# Altium footprint library Connector_Samtec_HLE_SMD.PcbLib: 290 footprints (part 7 of 24)
Each footprint in its own frame and in the unit in brackets; x right, y up, seen from the top. Pads: shape width x height; smd on the part's side, far side on the other; paste and mask are expansions set on the pad; w line width, h text height; cw(c..) or ccw(c..) is an arc to the next point about the centre after c.
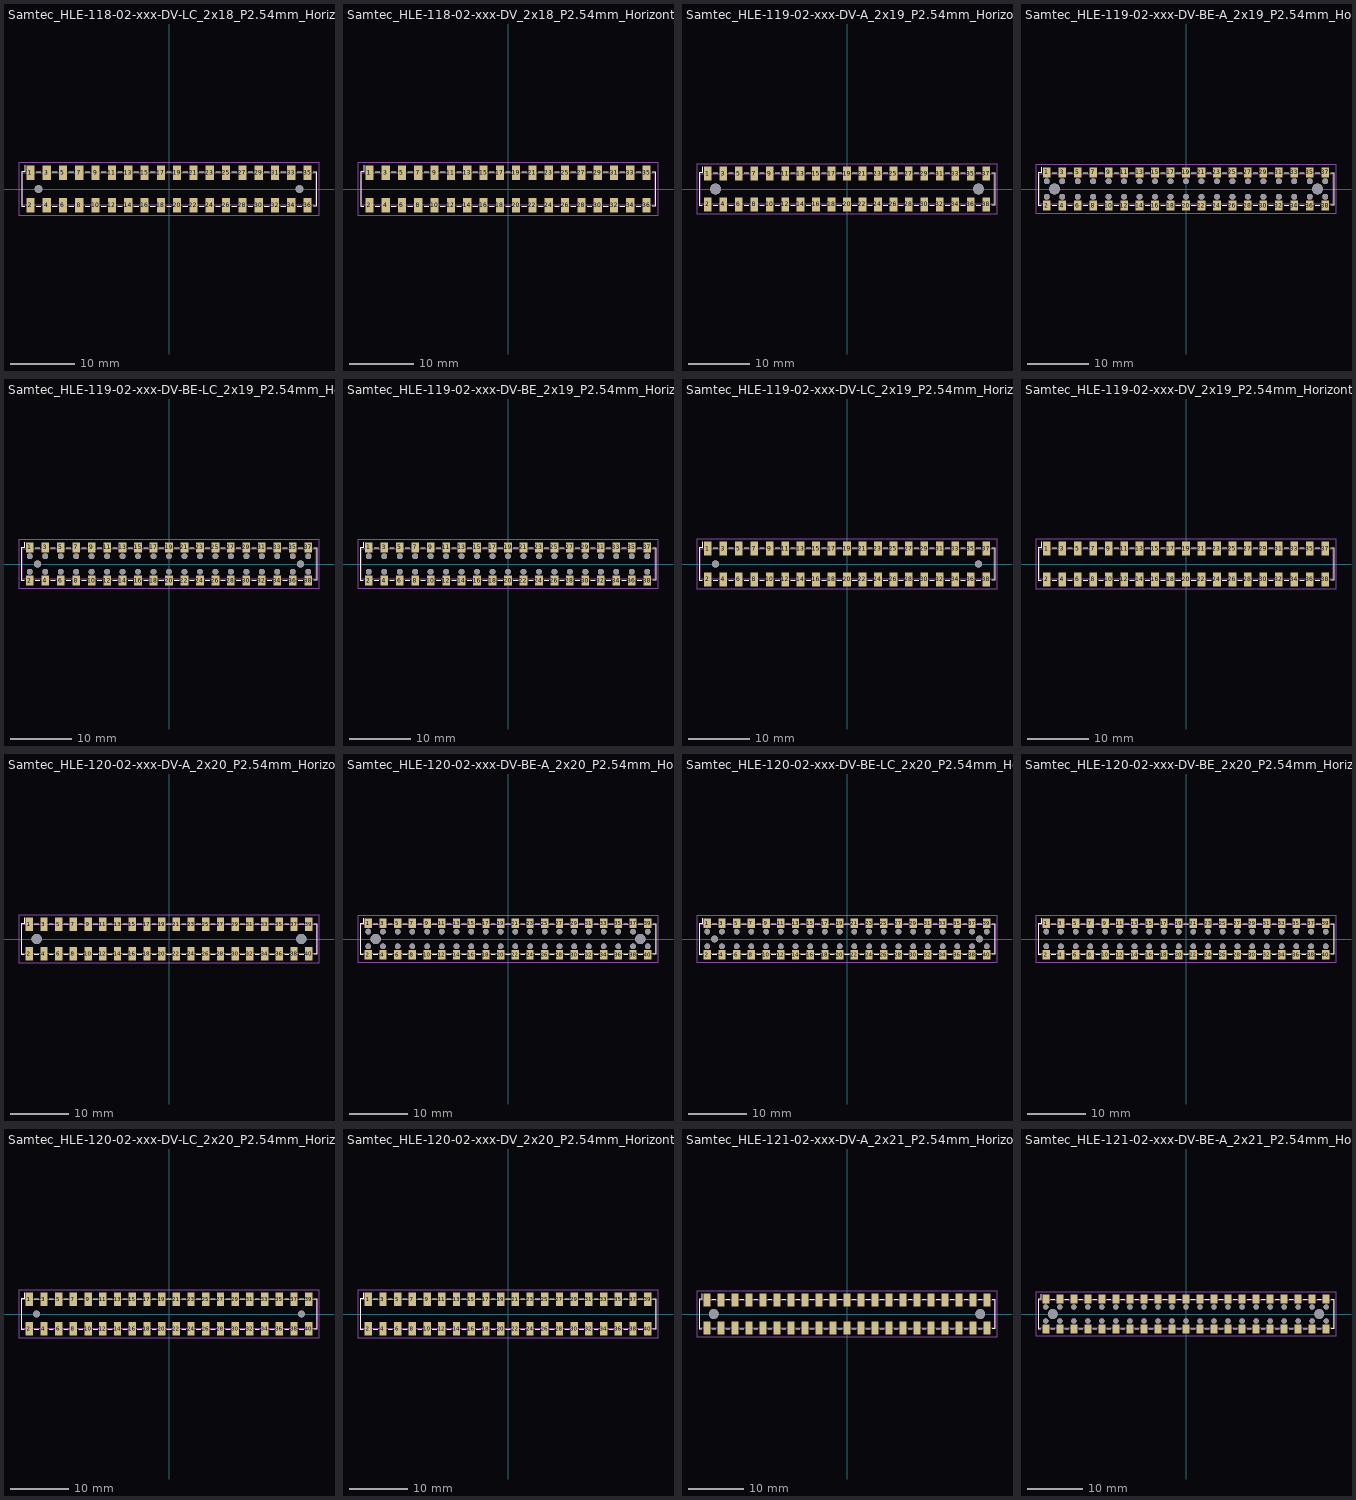
[diagram p6: the footprints below, top view; thin cyan lines are the x and y axes]

## Samtec_HLE-118-02-xxx-DV-LC_2x18_P2.54mm_Horizontal [mm]
pads (38):
  rect 1.27x2.29 smd: 1(-21.59,2.525) 2(-21.59,-2.525) 3(-19.05,2.525) 4(-19.05,-2.525) 5(-16.51,2.525) 6(-16.51,-2.525) 7(-13.97,2.525) 8(-13.97,-2.525) 9(-11.43,2.525) 10(-11.43,-2.525) 11(-8.89,2.525) 12(-8.89,-2.525) 13(-6.35,2.525) 14(-6.35,-2.525) 15(-3.81,2.525) 16(-3.81,-2.525) 17(-1.27,2.525) 18(-1.27,-2.525) 19(1.27,2.525) 20(1.27,-2.525) 21(3.81,2.525) 22(3.81,-2.525) 23(6.35,2.525) 24(6.35,-2.525) 25(8.89,2.525) 26(8.89,-2.525) 27(11.43,2.525) 28(11.43,-2.525) 29(13.97,2.525) 30(13.97,-2.525) 31(16.51,2.525) 32(16.51,-2.525) 33(19.05,2.525) 34(19.05,-2.525) 35(21.59,2.525) 36(21.59,-2.525)
  round 1.19 hole 1.19: Un1(20.32,0) Un2(-20.32,0)
F.SilkS:
  lines w0.12: -22.485,-2.65 -22.97,-2.65 -22.97,2.65 -22.485,2.65 -22.485,3.67 ; -20.695,-2.65 -19.945,-2.65 ; -20.695,2.65 -19.945,2.65 ; -18.155,-2.65 -17.405,-2.65 ; -18.155,2.65 -17.405,2.65 ; -15.615,-2.65 -14.865,-2.65 ; -15.615,2.65 -14.865,2.65 ; -13.075,-2.65 -12.325,-2.65 ; -13.075,2.65 -12.325,2.65 ; -10.535,-2.65 -9.785,-2.65 ; -10.535,2.65 -9.785,2.65 ; -7.995,-2.65 -7.245,-2.65 ; -7.995,2.65 -7.245,2.65 ; -5.455,-2.65 -4.705,-2.65 ; -5.455,2.65 -4.705,2.65 ; -2.915,-2.65 -2.165,-2.65 ; -2.915,2.65 -2.165,2.65 ; -0.375,-2.65 0.375,-2.65 ; -0.375,2.65 0.375,2.65 ; 2.165,-2.65 2.915,-2.65 ; 2.165,2.65 2.915,2.65 ; 4.705,-2.65 5.455,-2.65 ; 4.705,2.65 5.455,2.65 ; 7.245,-2.65 7.995,-2.65 ; 7.245,2.65 7.995,2.65 ; 9.785,-2.65 10.535,-2.65 ; 9.785,2.65 10.535,2.65 ; 12.325,-2.65 13.075,-2.65 ; 12.325,2.65 13.075,2.65 ; 14.865,-2.65 15.615,-2.65 ; 14.865,2.65 15.615,2.65 ; 17.405,-2.65 18.155,-2.65 ; 17.405,2.65 18.155,2.65 ; 19.945,-2.65 20.695,-2.65 ; 19.945,2.65 20.695,2.65 ; 22.485,-2.65 22.97,-2.65 22.97,2.65 22.485,2.65
F.CrtYd:
  lines w0.05: -23.36,-4.17 -23.36,4.17 23.36,4.17 23.36,-4.17 -23.36,-4.17
F.Fab:
  lines w0.1: -22.09,2.54 -21.59,1.833 -21.09,2.54 ; -22.86,-2.54 22.86,-2.54 22.86,2.54 -22.86,2.54 -22.86,-2.54
  text "'.Designator'" at -4.047,-2.68 h1

## Samtec_HLE-118-02-xxx-DV_2x18_P2.54mm_Horizontal [mm]
pads (36):
  rect 1.27x2.29 smd: 1(-21.59,2.525) 2(-21.59,-2.525) 3(-19.05,2.525) 4(-19.05,-2.525) 5(-16.51,2.525) 6(-16.51,-2.525) 7(-13.97,2.525) 8(-13.97,-2.525) 9(-11.43,2.525) 10(-11.43,-2.525) 11(-8.89,2.525) 12(-8.89,-2.525) 13(-6.35,2.525) 14(-6.35,-2.525) 15(-3.81,2.525) 16(-3.81,-2.525) 17(-1.27,2.525) 18(-1.27,-2.525) 19(1.27,2.525) 20(1.27,-2.525) 21(3.81,2.525) 22(3.81,-2.525) 23(6.35,2.525) 24(6.35,-2.525) 25(8.89,2.525) 26(8.89,-2.525) 27(11.43,2.525) 28(11.43,-2.525) 29(13.97,2.525) 30(13.97,-2.525) 31(16.51,2.525) 32(16.51,-2.525) 33(19.05,2.525) 34(19.05,-2.525) 35(21.59,2.525) 36(21.59,-2.525)
F.SilkS:
  lines w0.12: -22.485,-2.65 -22.97,-2.65 -22.97,2.65 -22.485,2.65 -22.485,3.67 ; -20.695,-2.65 -19.945,-2.65 ; -20.695,2.65 -19.945,2.65 ; -18.155,-2.65 -17.405,-2.65 ; -18.155,2.65 -17.405,2.65 ; -15.615,-2.65 -14.865,-2.65 ; -15.615,2.65 -14.865,2.65 ; -13.075,-2.65 -12.325,-2.65 ; -13.075,2.65 -12.325,2.65 ; -10.535,-2.65 -9.785,-2.65 ; -10.535,2.65 -9.785,2.65 ; -7.995,-2.65 -7.245,-2.65 ; -7.995,2.65 -7.245,2.65 ; -5.455,-2.65 -4.705,-2.65 ; -5.455,2.65 -4.705,2.65 ; -2.915,-2.65 -2.165,-2.65 ; -2.915,2.65 -2.165,2.65 ; -0.375,-2.65 0.375,-2.65 ; -0.375,2.65 0.375,2.65 ; 2.165,-2.65 2.915,-2.65 ; 2.165,2.65 2.915,2.65 ; 4.705,-2.65 5.455,-2.65 ; 4.705,2.65 5.455,2.65 ; 7.245,-2.65 7.995,-2.65 ; 7.245,2.65 7.995,2.65 ; 9.785,-2.65 10.535,-2.65 ; 9.785,2.65 10.535,2.65 ; 12.325,-2.65 13.075,-2.65 ; 12.325,2.65 13.075,2.65 ; 14.865,-2.65 15.615,-2.65 ; 14.865,2.65 15.615,2.65 ; 17.405,-2.65 18.155,-2.65 ; 17.405,2.65 18.155,2.65 ; 19.945,-2.65 20.695,-2.65 ; 19.945,2.65 20.695,2.65 ; 22.485,-2.65 22.97,-2.65 22.97,2.65 22.485,2.65
F.CrtYd:
  lines w0.05: -23.36,-4.17 -23.36,4.17 23.36,4.17 23.36,-4.17 -23.36,-4.17
F.Fab:
  lines w0.1: -22.09,2.54 -21.59,1.833 -21.09,2.54 ; -22.86,-2.54 -22.86,2.54 22.86,2.54 22.86,-2.54 -22.86,-2.54
  text "'.Designator'" at -4.047,-2.68 h1

## Samtec_HLE-119-02-xxx-DV-A_2x19_P2.54mm_Horizontal [mm]
pads (40):
  rect 1.27x2.29 smd: 1(-22.86,2.525) 2(-22.86,-2.525) 3(-20.32,2.525) 4(-20.32,-2.525) 5(-17.78,2.525) 6(-17.78,-2.525) 7(-15.24,2.525) 8(-15.24,-2.525) 9(-12.7,2.525) 10(-12.7,-2.525) 11(-10.16,2.525) 12(-10.16,-2.525) 13(-7.62,2.525) 14(-7.62,-2.525) 15(-5.08,2.525) 16(-5.08,-2.525) 17(-2.54,2.525) 18(-2.54,-2.525) 19(0,2.525) 20(0,-2.525) 21(2.54,2.525) 22(2.54,-2.525) 23(5.08,2.525) 24(5.08,-2.525) 25(7.62,2.525) 26(7.62,-2.525) 27(10.16,2.525) 28(10.16,-2.525) 29(12.7,2.525) 30(12.7,-2.525) 31(15.24,2.525) 32(15.24,-2.525) 33(17.78,2.525) 34(17.78,-2.525) 35(20.32,2.525) 36(20.32,-2.525) 37(22.86,2.525) 38(22.86,-2.525)
  round 1.78 hole 1.78: Un1(21.59,0) Un2(-21.59,0)
F.SilkS:
  lines w0.12: -23.755,-2.65 -24.24,-2.65 -24.24,2.65 -23.755,2.65 -23.755,3.67 ; -21.965,-2.65 -21.215,-2.65 ; -21.965,2.65 -21.215,2.65 ; -19.425,-2.65 -18.675,-2.65 ; -19.425,2.65 -18.675,2.65 ; -16.885,-2.65 -16.135,-2.65 ; -16.885,2.65 -16.135,2.65 ; -14.345,-2.65 -13.595,-2.65 ; -14.345,2.65 -13.595,2.65 ; -11.805,-2.65 -11.055,-2.65 ; -11.805,2.65 -11.055,2.65 ; -9.265,-2.65 -8.515,-2.65 ; -9.265,2.65 -8.515,2.65 ; -6.725,-2.65 -5.975,-2.65 ; -6.725,2.65 -5.975,2.65 ; -4.185,-2.65 -3.435,-2.65 ; -4.185,2.65 -3.435,2.65 ; -1.645,-2.65 -0.895,-2.65 ; -1.645,2.65 -0.895,2.65 ; 0.895,-2.65 1.645,-2.65 ; 0.895,2.65 1.645,2.65 ; 3.435,-2.65 4.185,-2.65 ; 3.435,2.65 4.185,2.65 ; 5.975,-2.65 6.725,-2.65 ; 5.975,2.65 6.725,2.65 ; 8.515,-2.65 9.265,-2.65 ; 8.515,2.65 9.265,2.65 ; 11.055,-2.65 11.805,-2.65 ; 11.055,2.65 11.805,2.65 ; 13.595,-2.65 14.345,-2.65 ; 13.595,2.65 14.345,2.65 ; 16.135,-2.65 16.885,-2.65 ; 16.135,2.65 16.885,2.65 ; 18.675,-2.65 19.425,-2.65 ; 18.675,2.65 19.425,2.65 ; 21.215,-2.65 21.965,-2.65 ; 21.215,2.65 21.965,2.65 ; 23.755,-2.65 24.24,-2.65 24.24,2.65 23.755,2.65
F.CrtYd:
  lines w0.05: -24.63,-4.17 24.63,-4.17 24.63,4.17 -24.63,4.17 -24.63,-4.17
F.Fab:
  lines w0.1: -23.36,2.54 -22.86,1.833 -22.36,2.54 ; -24.13,-2.54 24.13,-2.54 24.13,2.54 -24.13,2.54 -24.13,-2.54
  text "'.Designator'" at -4.047,-2.68 h1

## Samtec_HLE-119-02-xxx-DV-BE-A_2x19_P2.54mm_Horizontal [mm]
pads (78):
  rect 1.27x1.68 smd: 1(-22.86,2.72) 2(-22.86,-2.72) 3(-20.32,2.72) 4(-20.32,-2.72) 5(-17.78,2.72) 6(-17.78,-2.72) 7(-15.24,2.72) 8(-15.24,-2.72) 9(-12.7,2.72) 10(-12.7,-2.72) 11(-10.16,2.72) 12(-10.16,-2.72) 13(-7.62,2.72) 14(-7.62,-2.72) 15(-5.08,2.72) 16(-5.08,-2.72) 17(-2.54,2.72) 18(-2.54,-2.72) 19(0,2.72) 20(0,-2.72) 21(2.54,2.72) 22(2.54,-2.72) 23(5.08,2.72) 24(5.08,-2.72) 25(7.62,2.72) 26(7.62,-2.72) 27(10.16,2.72) 28(10.16,-2.72) 29(12.7,2.72) 30(12.7,-2.72) 31(15.24,2.72) 32(15.24,-2.72) 33(17.78,2.72) 34(17.78,-2.72) 35(20.32,2.72) 36(20.32,-2.72) 37(22.86,2.72) 38(22.86,-2.72)
  round 0.97 hole 0.97: Un1(-17.78,-1.27) Un2(-15.24,1.27) Un3(12.7,1.27) Un4(7.62,1.27) Un5(-15.24,-1.27) Un6(0,1.27) Un7(22.86,-1.27) Un8(2.54,-1.27) Un9(-20.32,1.27) Un10(0,-1.27) Un11(17.78,-1.27) Un12(-22.86,-1.27) Un13(-5.08,-1.27) Un14(10.16,1.27) Un15(20.32,-1.27) Un16(-17.78,1.27) Un17(-22.86,1.27) Un18(-7.62,-1.27) Un19(-10.16,1.27) Un20(10.16,-1.27) Un22(22.86,1.27) Un23(20.32,1.27) Un24(7.62,-1.27) Un25(-7.62,1.27) Un26(-5.08,1.27) Un27(-12.7,1.27) Un28(-12.7,-1.27) Un29(17.78,1.27) Un31(-10.16,-1.27) Un32(2.54,1.27) Un33(12.7,-1.27) Un34(15.24,-1.27) Un35(-2.54,-1.27) Un36(5.08,1.27) Un37(5.08,-1.27) Un38(15.24,1.27) Un39(-20.32,-1.27) Un40(-2.54,1.27)
  round 1.78 hole 1.78: Un21(21.59,0) Un30(-21.59,0)
F.SilkS:
  lines w0.12: -23.755,-2.65 -24.24,-2.65 -24.24,2.65 -23.755,2.65 -23.755,3.56 ; -21.965,-2.65 -21.215,-2.65 ; -21.965,2.65 -21.215,2.65 ; -19.425,-2.65 -18.675,-2.65 ; -19.425,2.65 -18.675,2.65 ; -16.885,-2.65 -16.135,-2.65 ; -16.885,2.65 -16.135,2.65 ; -14.345,-2.65 -13.595,-2.65 ; -14.345,2.65 -13.595,2.65 ; -11.805,-2.65 -11.055,-2.65 ; -11.805,2.65 -11.055,2.65 ; -9.265,-2.65 -8.515,-2.65 ; -9.265,2.65 -8.515,2.65 ; -6.725,-2.65 -5.975,-2.65 ; -6.725,2.65 -5.975,2.65 ; -4.185,-2.65 -3.435,-2.65 ; -4.185,2.65 -3.435,2.65 ; -1.645,-2.65 -0.895,-2.65 ; -1.645,2.65 -0.895,2.65 ; 0.895,-2.65 1.645,-2.65 ; 0.895,2.65 1.645,2.65 ; 3.435,-2.65 4.185,-2.65 ; 3.435,2.65 4.185,2.65 ; 5.975,-2.65 6.725,-2.65 ; 5.975,2.65 6.725,2.65 ; 8.515,-2.65 9.265,-2.65 ; 8.515,2.65 9.265,2.65 ; 11.055,-2.65 11.805,-2.65 ; 11.055,2.65 11.805,2.65 ; 13.595,-2.65 14.345,-2.65 ; 13.595,2.65 14.345,2.65 ; 16.135,-2.65 16.885,-2.65 ; 16.135,2.65 16.885,2.65 ; 18.675,-2.65 19.425,-2.65 ; 18.675,2.65 19.425,2.65 ; 21.215,-2.65 21.965,-2.65 ; 21.215,2.65 21.965,2.65 ; 23.755,-2.65 24.24,-2.65 24.24,2.65 23.755,2.65
F.CrtYd:
  lines w0.05: -24.63,-4.06 24.63,-4.06 24.63,4.06 -24.63,4.06 -24.63,-4.06
F.Fab:
  lines w0.1: -23.36,2.54 -22.86,1.833 -22.36,2.54 ; -24.13,-2.54 -24.13,2.54 24.13,2.54 24.13,-2.54 -24.13,-2.54
  text "'.Designator'" at -4.047,-2.68 h1

## Samtec_HLE-119-02-xxx-DV-BE-LC_2x19_P2.54mm_Horizontal [mm]
pads (78):
  rect 1.27x1.68 smd: 1(-22.86,2.72) 2(-22.86,-2.72) 3(-20.32,2.72) 4(-20.32,-2.72) 5(-17.78,2.72) 6(-17.78,-2.72) 7(-15.24,2.72) 8(-15.24,-2.72) 9(-12.7,2.72) 10(-12.7,-2.72) 11(-10.16,2.72) 12(-10.16,-2.72) 13(-7.62,2.72) 14(-7.62,-2.72) 15(-5.08,2.72) 16(-5.08,-2.72) 17(-2.54,2.72) 18(-2.54,-2.72) 19(0,2.72) 20(0,-2.72) 21(2.54,2.72) 22(2.54,-2.72) 23(5.08,2.72) 24(5.08,-2.72) 25(7.62,2.72) 26(7.62,-2.72) 27(10.16,2.72) 28(10.16,-2.72) 29(12.7,2.72) 30(12.7,-2.72) 31(15.24,2.72) 32(15.24,-2.72) 33(17.78,2.72) 34(17.78,-2.72) 35(20.32,2.72) 36(20.32,-2.72) 37(22.86,2.72) 38(22.86,-2.72)
  round 0.97 hole 0.97: Un1(0,-1.27) Un2(-2.54,-1.27) Un3(-15.24,1.27) Un4(-12.7,1.27) Un5(-10.16,-1.27) Un6(-10.16,1.27) Un7(-7.62,1.27) Un8(7.62,1.27) Un9(22.86,-1.27) Un10(12.7,-1.27) Un11(15.24,1.27) Un12(10.16,1.27) Un13(12.7,1.27) Un14(5.08,-1.27) Un15(17.78,1.27) Un16(-17.78,1.27) Un17(15.24,-1.27) Un18(10.16,-1.27) Un19(-20.32,1.27) Un20(0,1.27) Un21(-5.08,-1.27) Un22(-7.62,-1.27) Un23(-5.08,1.27) Un24(-17.78,-1.27) Un25(2.54,-1.27) Un27(7.62,-1.27) Un28(-22.86,-1.27) Un29(5.08,1.27) Un30(-15.24,-1.27) Un31(17.78,-1.27) Un32(-12.7,-1.27) Un34(20.32,-1.27) Un35(20.32,1.27) Un36(2.54,1.27) Un37(-20.32,-1.27) Un38(-22.86,1.27) Un39(22.86,1.27) Un40(-2.54,1.27)
  round 1.19 hole 1.19: Un26(-21.59,0) Un33(21.59,0)
F.SilkS:
  lines w0.12: -23.755,-2.65 -24.24,-2.65 -24.24,2.65 -23.755,2.65 -23.755,3.56 ; -21.965,-2.65 -21.215,-2.65 ; -21.965,2.65 -21.215,2.65 ; -19.425,-2.65 -18.675,-2.65 ; -19.425,2.65 -18.675,2.65 ; -16.885,-2.65 -16.135,-2.65 ; -16.885,2.65 -16.135,2.65 ; -14.345,-2.65 -13.595,-2.65 ; -14.345,2.65 -13.595,2.65 ; -11.805,-2.65 -11.055,-2.65 ; -11.805,2.65 -11.055,2.65 ; -9.265,-2.65 -8.515,-2.65 ; -9.265,2.65 -8.515,2.65 ; -6.725,-2.65 -5.975,-2.65 ; -6.725,2.65 -5.975,2.65 ; -4.185,-2.65 -3.435,-2.65 ; -4.185,2.65 -3.435,2.65 ; -1.645,-2.65 -0.895,-2.65 ; -1.645,2.65 -0.895,2.65 ; 0.895,-2.65 1.645,-2.65 ; 0.895,2.65 1.645,2.65 ; 3.435,-2.65 4.185,-2.65 ; 3.435,2.65 4.185,2.65 ; 5.975,-2.65 6.725,-2.65 ; 5.975,2.65 6.725,2.65 ; 8.515,-2.65 9.265,-2.65 ; 8.515,2.65 9.265,2.65 ; 11.055,-2.65 11.805,-2.65 ; 11.055,2.65 11.805,2.65 ; 13.595,-2.65 14.345,-2.65 ; 13.595,2.65 14.345,2.65 ; 16.135,-2.65 16.885,-2.65 ; 16.135,2.65 16.885,2.65 ; 18.675,-2.65 19.425,-2.65 ; 18.675,2.65 19.425,2.65 ; 21.215,-2.65 21.965,-2.65 ; 21.215,2.65 21.965,2.65 ; 23.755,-2.65 24.24,-2.65 24.24,2.65 23.755,2.65
F.CrtYd:
  lines w0.05: -24.63,-4.06 24.63,-4.06 24.63,4.06 -24.63,4.06 -24.63,-4.06
F.Fab:
  lines w0.1: -23.36,2.54 -22.86,1.833 -22.36,2.54 ; -24.13,-2.54 24.13,-2.54 24.13,2.54 -24.13,2.54 -24.13,-2.54
  text "'.Designator'" at -4.047,-2.68 h1

## Samtec_HLE-119-02-xxx-DV-BE_2x19_P2.54mm_Horizontal [mm]
pads (76):
  rect 1.27x1.68 smd: 1(-22.86,2.72) 2(-22.86,-2.72) 3(-20.32,2.72) 4(-20.32,-2.72) 5(-17.78,2.72) 6(-17.78,-2.72) 7(-15.24,2.72) 8(-15.24,-2.72) 9(-12.7,2.72) 10(-12.7,-2.72) 11(-10.16,2.72) 12(-10.16,-2.72) 13(-7.62,2.72) 14(-7.62,-2.72) 15(-5.08,2.72) 16(-5.08,-2.72) 17(-2.54,2.72) 18(-2.54,-2.72) 19(0,2.72) 20(0,-2.72) 21(2.54,2.72) 22(2.54,-2.72) 23(5.08,2.72) 24(5.08,-2.72) 25(7.62,2.72) 26(7.62,-2.72) 27(10.16,2.72) 28(10.16,-2.72) 29(12.7,2.72) 30(12.7,-2.72) 31(15.24,2.72) 32(15.24,-2.72) 33(17.78,2.72) 34(17.78,-2.72) 35(20.32,2.72) 36(20.32,-2.72) 37(22.86,2.72) 38(22.86,-2.72)
  round 0.97 hole 0.97: Un1(-17.78,-1.27) Un2(22.86,1.27) Un3(-22.86,1.27) Un4(20.32,-1.27) Un5(10.16,-1.27) Un6(-15.24,-1.27) Un7(-2.54,1.27) Un8(-10.16,-1.27) Un9(-10.16,1.27) Un10(12.7,-1.27) Un11(22.86,-1.27) Un12(-22.86,-1.27) Un13(-12.7,-1.27) Un14(5.08,1.27) Un15(-20.32,-1.27) Un16(5.08,-1.27) Un17(-2.54,-1.27) Un18(-5.08,1.27) Un19(10.16,1.27) Un20(-7.62,1.27) Un21(7.62,1.27) Un22(-7.62,-1.27) Un23(15.24,-1.27) Un24(-12.7,1.27) Un25(0,1.27) Un26(-20.32,1.27) Un27(0,-1.27) Un28(20.32,1.27) Un29(17.78,1.27) Un30(-5.08,-1.27) Un31(12.7,1.27) Un32(-17.78,1.27) Un33(2.54,1.27) Un34(-15.24,1.27) Un35(15.24,1.27) Un36(2.54,-1.27) Un37(7.62,-1.27) Un38(17.78,-1.27)
F.SilkS:
  lines w0.12: -23.755,-2.65 -24.24,-2.65 -24.24,2.65 -23.755,2.65 -23.755,3.56 ; -21.965,-2.65 -21.215,-2.65 ; -21.965,2.65 -21.215,2.65 ; -19.425,-2.65 -18.675,-2.65 ; -19.425,2.65 -18.675,2.65 ; -16.885,-2.65 -16.135,-2.65 ; -16.885,2.65 -16.135,2.65 ; -14.345,-2.65 -13.595,-2.65 ; -14.345,2.65 -13.595,2.65 ; -11.805,-2.65 -11.055,-2.65 ; -11.805,2.65 -11.055,2.65 ; -9.265,-2.65 -8.515,-2.65 ; -9.265,2.65 -8.515,2.65 ; -6.725,-2.65 -5.975,-2.65 ; -6.725,2.65 -5.975,2.65 ; -4.185,-2.65 -3.435,-2.65 ; -4.185,2.65 -3.435,2.65 ; -1.645,-2.65 -0.895,-2.65 ; -1.645,2.65 -0.895,2.65 ; 0.895,-2.65 1.645,-2.65 ; 0.895,2.65 1.645,2.65 ; 3.435,-2.65 4.185,-2.65 ; 3.435,2.65 4.185,2.65 ; 5.975,-2.65 6.725,-2.65 ; 5.975,2.65 6.725,2.65 ; 8.515,-2.65 9.265,-2.65 ; 8.515,2.65 9.265,2.65 ; 11.055,-2.65 11.805,-2.65 ; 11.055,2.65 11.805,2.65 ; 13.595,-2.65 14.345,-2.65 ; 13.595,2.65 14.345,2.65 ; 16.135,-2.65 16.885,-2.65 ; 16.135,2.65 16.885,2.65 ; 18.675,-2.65 19.425,-2.65 ; 18.675,2.65 19.425,2.65 ; 21.215,-2.65 21.965,-2.65 ; 21.215,2.65 21.965,2.65 ; 23.755,-2.65 24.24,-2.65 24.24,2.65 23.755,2.65
F.CrtYd:
  lines w0.05: -24.63,-4.06 -24.63,4.06 24.63,4.06 24.63,-4.06 -24.63,-4.06
F.Fab:
  lines w0.1: -23.36,2.54 -22.86,1.833 -22.36,2.54 ; -24.13,-2.54 -24.13,2.54 24.13,2.54 24.13,-2.54 -24.13,-2.54
  text "'.Designator'" at -4.047,-2.68 h1

## Samtec_HLE-119-02-xxx-DV-LC_2x19_P2.54mm_Horizontal [mm]
pads (40):
  rect 1.27x2.29 smd: 1(-22.86,2.525) 2(-22.86,-2.525) 3(-20.32,2.525) 4(-20.32,-2.525) 5(-17.78,2.525) 6(-17.78,-2.525) 7(-15.24,2.525) 8(-15.24,-2.525) 9(-12.7,2.525) 10(-12.7,-2.525) 11(-10.16,2.525) 12(-10.16,-2.525) 13(-7.62,2.525) 14(-7.62,-2.525) 15(-5.08,2.525) 16(-5.08,-2.525) 17(-2.54,2.525) 18(-2.54,-2.525) 19(0,2.525) 20(0,-2.525) 21(2.54,2.525) 22(2.54,-2.525) 23(5.08,2.525) 24(5.08,-2.525) 25(7.62,2.525) 26(7.62,-2.525) 27(10.16,2.525) 28(10.16,-2.525) 29(12.7,2.525) 30(12.7,-2.525) 31(15.24,2.525) 32(15.24,-2.525) 33(17.78,2.525) 34(17.78,-2.525) 35(20.32,2.525) 36(20.32,-2.525) 37(22.86,2.525) 38(22.86,-2.525)
  round 1.19 hole 1.19: Un1(21.59,0) Un2(-21.59,0)
F.SilkS:
  lines w0.12: -23.755,-2.65 -24.24,-2.65 -24.24,2.65 -23.755,2.65 -23.755,3.67 ; -21.965,-2.65 -21.215,-2.65 ; -21.965,2.65 -21.215,2.65 ; -19.425,-2.65 -18.675,-2.65 ; -19.425,2.65 -18.675,2.65 ; -16.885,-2.65 -16.135,-2.65 ; -16.885,2.65 -16.135,2.65 ; -14.345,-2.65 -13.595,-2.65 ; -14.345,2.65 -13.595,2.65 ; -11.805,-2.65 -11.055,-2.65 ; -11.805,2.65 -11.055,2.65 ; -9.265,-2.65 -8.515,-2.65 ; -9.265,2.65 -8.515,2.65 ; -6.725,-2.65 -5.975,-2.65 ; -6.725,2.65 -5.975,2.65 ; -4.185,-2.65 -3.435,-2.65 ; -4.185,2.65 -3.435,2.65 ; -1.645,-2.65 -0.895,-2.65 ; -1.645,2.65 -0.895,2.65 ; 0.895,-2.65 1.645,-2.65 ; 0.895,2.65 1.645,2.65 ; 3.435,-2.65 4.185,-2.65 ; 3.435,2.65 4.185,2.65 ; 5.975,-2.65 6.725,-2.65 ; 5.975,2.65 6.725,2.65 ; 8.515,-2.65 9.265,-2.65 ; 8.515,2.65 9.265,2.65 ; 11.055,-2.65 11.805,-2.65 ; 11.055,2.65 11.805,2.65 ; 13.595,-2.65 14.345,-2.65 ; 13.595,2.65 14.345,2.65 ; 16.135,-2.65 16.885,-2.65 ; 16.135,2.65 16.885,2.65 ; 18.675,-2.65 19.425,-2.65 ; 18.675,2.65 19.425,2.65 ; 21.215,-2.65 21.965,-2.65 ; 21.215,2.65 21.965,2.65 ; 23.755,-2.65 24.24,-2.65 24.24,2.65 23.755,2.65
F.CrtYd:
  lines w0.05: -24.63,-4.17 -24.63,4.17 24.63,4.17 24.63,-4.17 -24.63,-4.17
F.Fab:
  lines w0.1: -23.36,2.54 -22.86,1.833 -22.36,2.54 ; -24.13,-2.54 -24.13,2.54 24.13,2.54 24.13,-2.54 -24.13,-2.54
  text "'.Designator'" at -4.047,-2.68 h1
